# Altium footprint library ICs And Semiconductors SMD.PcbLib: 602 footprints (part 1 of 38)
Each footprint in its own frame and in the unit in brackets; x right, y up, seen from the top. Pads: shape width x height; smd on the part's side, far side on the other; paste and mask are expansions set on the pad; w line width, h text height; cw(c..) or ccw(c..) is an arc to the next point about the centre after c.
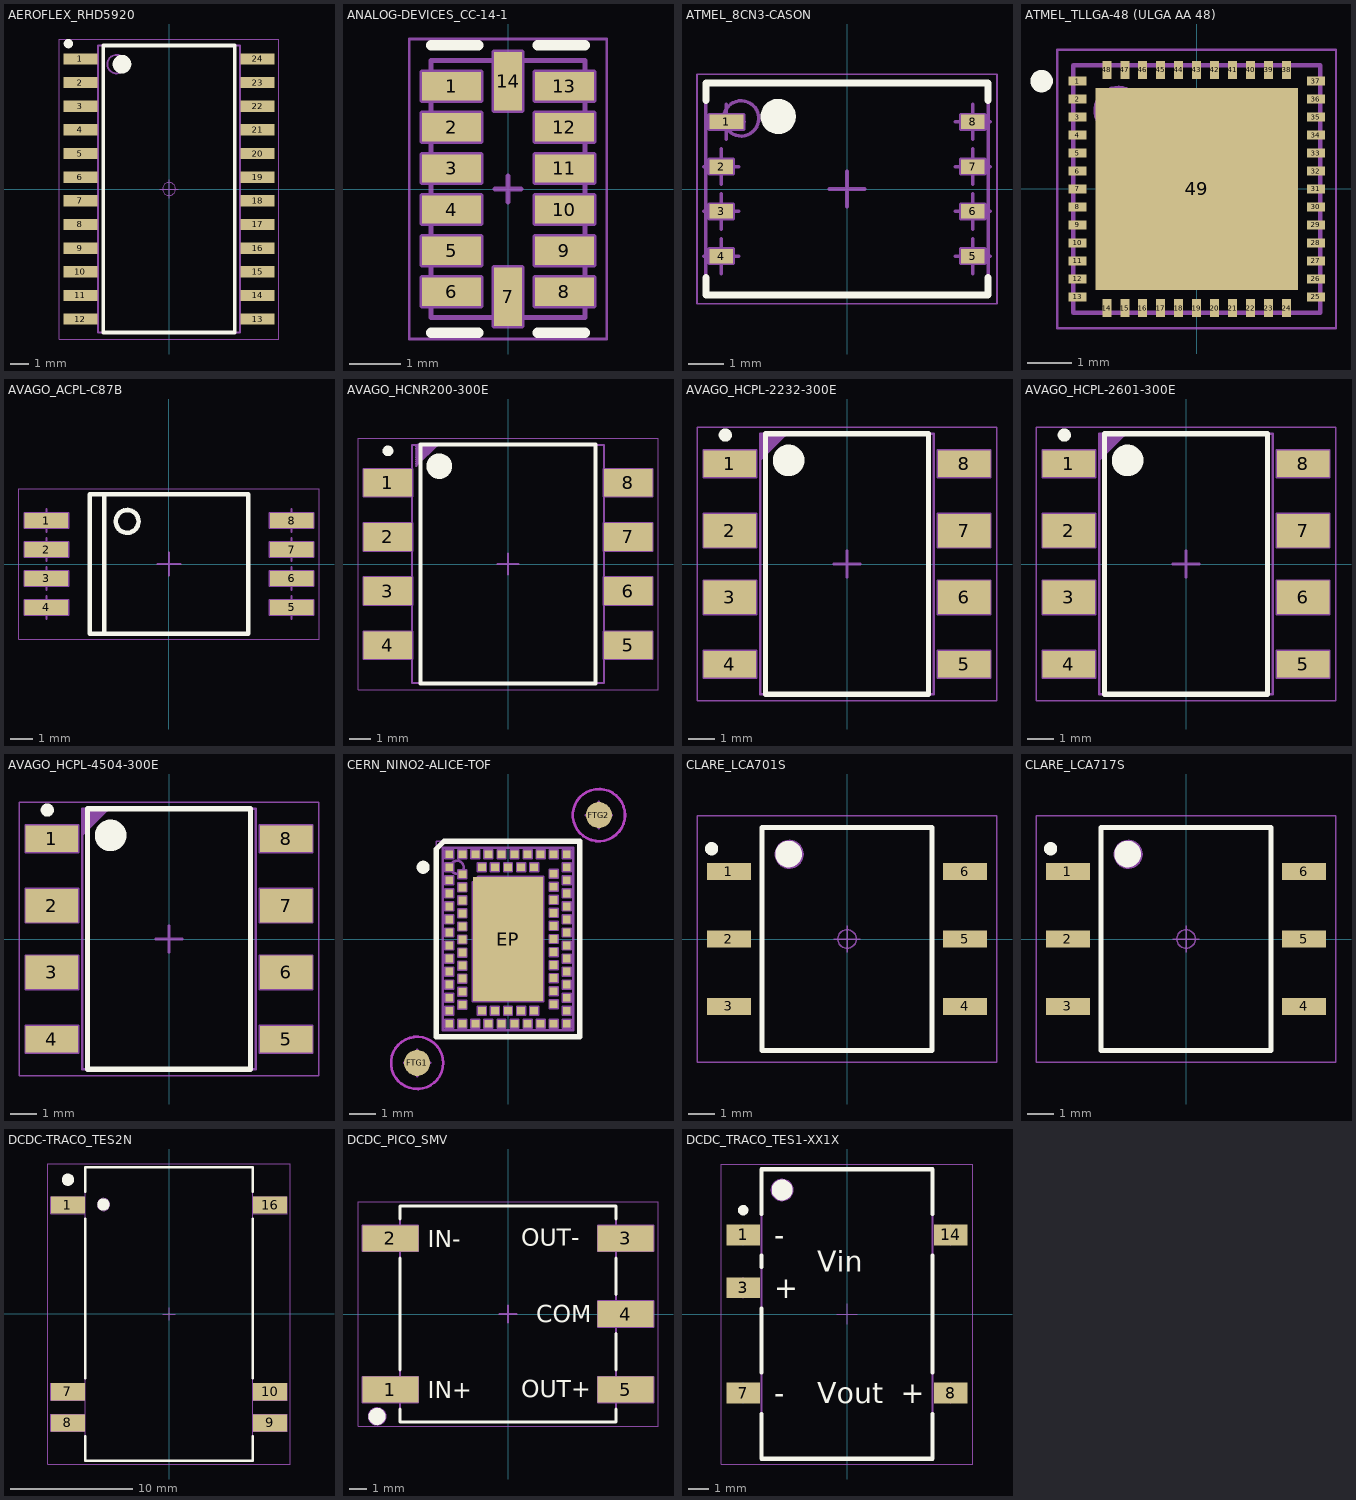
[diagram p0: the footprints below, top view; thin cyan lines are the x and y axes]

## AEROFLEX_RHD5920 [mm] "Hermetic Ceramic SOIC, 1.27mm Pitch; 24 Pin, 7.62mm W X 15.59mm L X 3.048mm H Body"
height 3.048
pads (24):
  rect 1.8x0.6 smd: 1(-4.75,6.985) 2(-4.75,5.715) 3(-4.75,4.445) 4(-4.75,3.175) 5(-4.75,1.905) 6(-4.75,0.635) 7(-4.75,-0.635) 8(-4.75,-1.905) 9(-4.75,-3.175) 10(-4.75,-4.445) 11(-4.75,-5.715) 12(-4.75,-6.985) 13(4.75,-6.985) 14(4.75,-5.715) 15(4.75,-4.445) 16(4.75,-3.175) 17(4.75,-1.905) 18(4.75,-0.635) 19(4.75,0.635) 20(4.75,1.905) 21(4.75,3.175) 22(4.75,4.445) 23(4.75,5.715) 24(4.75,6.985)
Top Overlay:
  circle w0.5: c-2.525,6.7 r0.25
  circle w0.25: c-5.4,7.8 r0.125
  lines w0.2: -3.525,-7.7 3.525,-7.7 3.525,7.7 -3.525,7.7 -3.525,-7.7
Mechanical 14:
  circle w0.1: c-2.81,6.7 r0.5
  lines w0.1: -3.81,-7.7 3.81,-7.7 3.81,7.7 -3.81,7.7 -3.81,-7.7
Mechanical 15:
  circle w0.05: c0,0 r0.35
  lines w0.05: -0.5,0 0.5,0 ; 0,-0.5 0,0.5 ; -5.9,-8.05 5.9,-8.05 5.9,8.05 -5.9,8.05 -5.9,-8.05
3D body "AEROFLEX_RHD5920.stp": height 3.05, standoff 0, extent -5.16,-7.8 5.16,7.8

## ANALOG-DEVICES_CC-14-1 [mm] "LGA, 0.50mm pitch, 14 Pin, 3.00mm L X 5.00mm W X 1.00mm H body, ANALOG DEVICE CC-14-1"
height 1
pads (14):
  rect 1.145x0.55 smd: 1(-1.098,2) 2(-1.098,1.2) 3(-1.098,0.4) 4(-1.098,-0.4) 5(-1.098,-1.2) 6(-1.098,-2) 8(1.098,-2) 9(1.098,-1.2) 10(1.098,-0.4) 11(1.098,0.4) 12(1.098,1.2) 13(1.098,2)
  rect 0.55x1.145 smd: 7(0,-2.098) 14(0,2.098)
Top Overlay:
  lines w0.2: -1.5,-2.8 -0.575,-2.8 ; -1.5,2.8 -0.575,2.8 ; 0.575,-2.8 1.5,-2.8 ; 0.575,2.8 1.5,2.8
Mechanical 8:
  lines w0.1: -1.348,-2 -1.098,-2 ; -1.348,-1.2 -1.098,-1.2 ; -1.348,-0.4 -1.098,-0.4 ; -1.348,0.4 -1.098,0.4 ; -1.348,1.2 -1.098,1.2 ; -1.348,2 -1.098,2 ; -1.098,-2.25 -1.098,-2 ; -1.098,-1.75 -1.098,-2 ; -1.098,-1.45 -1.098,-1.2 ; -1.098,-0.95 -1.098,-1.2 ; -1.098,-0.65 -1.098,-0.4 ; -1.098,-0.15 -1.098,-0.4 ; -1.098,0.15 -1.098,0.4 ; -1.098,0.65 -1.098,0.4 ; -1.098,0.95 -1.098,1.2 ; -1.098,1.45 -1.098,1.2 ; -1.098,1.75 -1.098,2 ; -1.098,2.25 -1.098,2 ; -0.848,-2 -1.098,-2 ; -0.848,-1.2 -1.098,-1.2 ; -0.848,-0.4 -1.098,-0.4 ; -0.848,0.4 -1.098,0.4 ; -0.848,1.2 -1.098,1.2 ; -0.848,2 -1.098,2 ; -0.25,-2.098 0,-2.098 ; -0.25,0 0,0 ; -0.25,2.098 0,2.098 ; 0,-2.348 0,-2.098 ; 0,-1.848 0,-2.098 ; 0,-0.25 0,0 ; 0,0.25 0,0 ; 0,1.848 0,2.098 ; 0,2.348 0,2.098 ; 0.25,-2.098 0,-2.098 ; 0.25,0 0,0 ; 0.25,2.098 0,2.098 ; 0.848,-2 1.098,-2 ; 0.848,-1.2 1.098,-1.2 ; 0.848,-0.4 1.098,-0.4 ; 0.848,0.4 1.098,0.4 ; 0.848,1.2 1.098,1.2 ; 0.848,2 1.098,2 ; 1.098,-2.25 1.098,-2 ; 1.098,-1.75 1.098,-2 ; 1.098,-1.45 1.098,-1.2 ; 1.098,-0.95 1.098,-1.2 ; 1.098,-0.65 1.098,-0.4 ; 1.098,-0.15 1.098,-0.4 ; 1.098,0.15 1.098,0.4 ; 1.098,0.65 1.098,0.4 ; 1.098,0.95 1.098,1.2 ; 1.098,1.45 1.098,1.2 ; 1.098,1.75 1.098,2 ; 1.098,2.25 1.098,2 ; 1.348,-2 1.098,-2 ; 1.348,-1.2 1.098,-1.2 ; 1.348,-0.4 1.098,-0.4 ; 1.348,0.4 1.098,0.4 ; 1.348,1.2 1.098,1.2 ; 1.348,2 1.098,2 ; -1.67,-2.275 -1.67,-1.725 -0.525,-1.725 -0.525,-2.275 -1.67,-2.275 ; -1.67,-1.475 -1.67,-0.925 -0.525,-0.925 -0.525,-1.475 -1.67,-1.475 ; -1.67,-0.675 -1.67,-0.125 -0.525,-0.125 -0.525,-0.675 -1.67,-0.675 ; -1.67,0.125 -1.67,0.675 -0.525,0.675 -0.525,0.125 -1.67,0.125 ; -1.67,0.925 -1.67,1.475 -0.525,1.475 -0.525,0.925 -1.67,0.925 ; -1.67,1.725 -1.67,2.275 -0.525,2.275 -0.525,1.725 -1.67,1.725 ; -0.275,-2.67 -0.275,-1.525 0.275,-1.525 0.275,-2.67 -0.275,-2.67 ; -0.275,1.525 -0.275,2.67 0.275,2.67 0.275,1.525 -0.275,1.525 ; 0.525,-2.275 1.67,-2.275 1.67,-1.725 0.525,-1.725 0.525,-2.275 ; 0.525,-1.475 1.67,-1.475 1.67,-0.925 0.525,-0.925 0.525,-1.475 ; 0.525,-0.675 1.67,-0.675 1.67,-0.125 0.525,-0.125 0.525,-0.675 ; 0.525,0.125 1.67,0.125 1.67,0.675 0.525,0.675 0.525,0.125 ; 0.525,0.925 1.67,0.925 1.67,1.475 0.525,1.475 0.525,0.925 ; 0.525,1.725 1.67,1.725 1.67,2.275 0.525,2.275 0.525,1.725
Mechanical 14:
  circle w0.1: c-1,2 r0.25
  lines w0.1: -1.5,-2.5 1.5,-2.5 1.5,2.5 -1.5,2.5 -1.5,-2.5
Mechanical 15:
  lines w0.05: -1.92,-2.92 1.92,-2.92 1.92,2.92 -1.92,2.92 -1.92,-2.92
3D body "ANALOG-DEVICES_CC-14-1.stp": height 0.79, standoff 0, extent -1.5,-2.5 1.5,2.5

## ATMEL_8CN3-CASON [mm] "ATMEL 8CN3 Case, SON, 1.27mm Pitch; 8 Pin, 8.00mm W X 6.00mm L X 1.00mm H body"
height 1
pads (8):
  rect 0.97x0.41 smd: 1(-3.415,1.905)
  rect 0.67x0.41 smd: 2(-3.565,0.635) 3(-3.565,-0.635) 4(-3.565,-1.905) 5(3.565,-1.905) 6(3.565,-0.635) 7(3.565,0.635) 8(3.565,1.905)
Top Overlay:
  circle w0.5: c-1.95,2.055 r0.25
  lines w0.2: -4,-2.51 -4,-3 4,-3 4,-2.51 ; -4,2.51 -4,3 4,3 4,2.51
Mechanical 8:
  lines w0.1: -4.065,-1.905 -3.565,-1.905 ; -4.065,-0.635 -3.565,-0.635 ; -4.065,0.635 -3.565,0.635 ; -3.915,1.905 -3.415,1.905 ; -3.565,-2.405 -3.565,-1.905 ; -3.565,-1.405 -3.565,-1.905 ; -3.565,-1.135 -3.565,-0.635 ; -3.565,-0.135 -3.565,-0.635 ; -3.565,0.135 -3.565,0.635 ; -3.565,1.135 -3.565,0.635 ; -3.415,1.405 -3.415,1.905 ; -3.415,2.405 -3.415,1.905 ; -3.065,-1.905 -3.565,-1.905 ; -3.065,-0.635 -3.565,-0.635 ; -3.065,0.635 -3.565,0.635 ; -2.915,1.905 -3.415,1.905 ; -0.5,0 0,0 ; 0,-0.5 0,0 ; 0,0.5 0,0 ; 0.5,0 0,0 ; 3.065,-1.905 3.565,-1.905 ; 3.065,-0.635 3.565,-0.635 ; 3.065,0.635 3.565,0.635 ; 3.065,1.905 3.565,1.905 ; 3.565,-2.405 3.565,-1.905 ; 3.565,-1.405 3.565,-1.905 ; 3.565,-1.135 3.565,-0.635 ; 3.565,-0.135 3.565,-0.635 ; 3.565,0.135 3.565,0.635 ; 3.565,1.135 3.565,0.635 ; 3.565,1.405 3.565,1.905 ; 3.565,2.405 3.565,1.905 ; 4.065,-1.905 3.565,-1.905 ; 4.065,-0.635 3.565,-0.635 ; 4.065,0.635 3.565,0.635 ; 4.065,1.905 3.565,1.905 ; -3.9,-2.11 -3.9,-1.7 -3.23,-1.7 -3.23,-2.11 -3.9,-2.11 ; -3.9,-0.84 -3.9,-0.43 -3.23,-0.43 -3.23,-0.84 -3.9,-0.84 ; -3.9,0.43 -3.9,0.84 -3.23,0.84 -3.23,0.43 -3.9,0.43 ; -3.9,1.7 -3.9,2.11 -2.93,2.11 -2.93,1.7 -3.9,1.7 ; 3.23,-2.11 3.9,-2.11 3.9,-1.7 3.23,-1.7 3.23,-2.11 ; 3.23,-0.84 3.9,-0.84 3.9,-0.43 3.23,-0.43 3.23,-0.84 ; 3.23,0.43 3.23,0.84 3.9,0.84 3.9,0.43 3.23,0.43 ; 3.23,1.7 3.23,2.11 3.9,2.11 3.9,1.7 3.23,1.7
Mechanical 14:
  circle w0.1: c-3,2 r0.5
  lines w0.1: -4,-3 4,-3 4,3 -4,3 -4,-3
Mechanical 15:
  lines w0.05: -4.25,-3.25 4.25,-3.25 4.25,3.25 -4.25,3.25 -4.25,-3.25
3D body "ATMEL_8CN3-CASON.stp": height 1, standoff 0, extent -4,-3 4,3

## ATMEL_TLLGA-48 (ULGA AA 48) [mm] "QFN,0.40mm pitch,square;48 pin,5.50mm L X 5.50mm W X 0.60mm H body (w/pullback leads,thermal tab 4.5 X 4.5mm), IPC Medium Density"
height 0.6
pads (49):
  rect 0.4x0.2 smd: 1(-2.65,2.4) 2(-2.65,2) 3(-2.65,1.6) 4(-2.65,1.2) 5(-2.65,0.8) 6(-2.65,0.4) 7(-2.65,0) 8(-2.65,-0.4) 9(-2.65,-0.8) 10(-2.65,-1.2) 11(-2.65,-1.6) 12(-2.65,-2) 13(-2.65,-2.4) 25(2.65,-2.4) 26(2.65,-2) 27(2.65,-1.6) 28(2.65,-1.2) 29(2.65,-0.8) 30(2.65,-0.4) 31(2.65,0) 32(2.65,0.4) 33(2.65,0.8) 34(2.65,1.2) 35(2.65,1.6) 36(2.65,2) 37(2.65,2.4)
  rect 0.2x0.4 smd: 14(-2,-2.65) 15(-1.6,-2.65) 16(-1.2,-2.65) 17(-0.8,-2.65) 18(-0.4,-2.65) 19(0,-2.65) 20(0.4,-2.65) 21(0.8,-2.65) 22(1.2,-2.65) 23(1.6,-2.65) 24(2,-2.65) 38(2,2.65) 39(1.6,2.65) 40(1.2,2.65) 41(0.8,2.65) 42(0.4,2.65) 43(0,2.65) 44(-0.4,2.65) 45(-0.8,2.65) 46(-1.2,2.65) 47(-1.6,2.65) 48(-2,2.65)
  rect 4.5x4.5 smd: 49(0,0)
Top Overlay:
  circle w0.25: c-3.45,2.4 r0.125
Top Paste:
  region: -1.7,-1.7 -1.7,-0.28 -0.28,-0.28 -0.28,-1.7
  region: 0.28,-1.7 0.28,-0.28 1.7,-0.28 1.7,-1.7
  region: -1.7,0.28 -1.7,1.7 -0.28,1.7 -0.28,0.28
  region: 0.28,0.28 0.28,1.7 1.7,1.7 1.7,0.28
Mechanical 14:
  circle w0.1: c-1.75,1.75 r0.5
  lines w0.1: -2.75,-2.75 -2.75,2.75 2.75,2.75 2.75,-2.75 -2.75,-2.75
  text "1" at 0.45,-0.164 h0.75
Mechanical 15:
  circle w0.05: c0,0 r0.35
  lines w0.05: -0.5,0 0.5,0 ; 0,-0.5 0,0.5 ; -3.1,-3.1 -3.1,3.1 3.1,3.1 3.1,-3.1 -3.1,-3.1
3D body "ATMEL_TLLGA-48 (ULGA AA 48).stp": height 0.6, standoff 0, extent -2.75,-2.75 2.75,2.75

## AVAGO_ACPL-C87B [mm] "8-Leads Stretched Surface Mount SO Package, Body 6.807x5.859mm, Pitch 1.27mm"
height 3.6
pads (8):
  rect 1.905x0.64 smd: 1(-5.372,1.905) 2(-5.372,0.635) 3(-5.372,-0.635) 4(-5.372,-1.905) 5(5.373,-1.905) 6(5.373,-0.635) 7(5.373,0.635) 8(5.373,1.905)
Top Overlay:
  circle w0.2: c-1.832,1.867 r0.5
  lines w0.2: -2.832,-3.052 -2.832,3.052 ; -3.467,-3.052 3.467,-3.052 3.467,3.052 -3.467,3.052 -3.467,-3.052
Mechanical 8:
  lines w0.1: -5.872,-1.905 -5.372,-1.905 ; -5.872,-0.635 -5.372,-0.635 ; -5.872,0.635 -5.372,0.635 ; -5.872,1.905 -5.372,1.905 ; -5.372,-2.405 -5.372,-1.905 ; -5.372,-1.405 -5.372,-1.905 ; -5.372,-1.135 -5.372,-0.635 ; -5.372,-0.135 -5.372,-0.635 ; -5.372,0.135 -5.372,0.635 ; -5.372,1.135 -5.372,0.635 ; -5.372,1.405 -5.372,1.905 ; -5.372,2.405 -5.372,1.905 ; -4.872,-1.905 -5.372,-1.905 ; -4.872,-0.635 -5.372,-0.635 ; -4.872,0.635 -5.372,0.635 ; -4.872,1.905 -5.372,1.905 ; -0.5,0 0,0 ; 0,-0.5 0,0 ; 0,0.5 0,0 ; 0.5,0 0,0 ; 4.873,-1.905 5.373,-1.905 ; 4.873,-0.635 5.373,-0.635 ; 4.873,0.635 5.373,0.635 ; 4.873,1.905 5.373,1.905 ; 5.373,-2.405 5.373,-1.905 ; 5.373,-1.405 5.373,-1.905 ; 5.373,-1.135 5.373,-0.635 ; 5.373,-0.135 5.373,-0.635 ; 5.373,0.135 5.373,0.635 ; 5.373,1.135 5.373,0.635 ; 5.373,1.405 5.373,1.905 ; 5.373,2.405 5.373,1.905 ; 5.873,-1.905 5.373,-1.905 ; 5.873,-0.635 5.373,-0.635 ; 5.873,0.635 5.373,0.635 ; 5.873,1.905 5.373,1.905 ; -6.325,-2.225 -6.325,-1.585 -4.42,-1.585 -4.42,-2.225 -6.325,-2.225 ; -6.325,-0.955 -6.325,-0.315 -4.42,-0.315 -4.42,-0.955 -6.325,-0.955 ; -6.325,0.315 -6.325,0.955 -4.42,0.955 -4.42,0.315 -6.325,0.315 ; -6.325,1.585 -6.325,2.225 -4.42,2.225 -4.42,1.585 -6.325,1.585 ; 4.42,-2.225 4.42,-1.585 6.325,-1.585 6.325,-2.225 4.42,-2.225 ; 4.42,-0.955 4.42,-0.315 6.325,-0.315 6.325,-0.955 4.42,-0.955 ; 4.42,0.315 4.42,0.955 6.325,0.955 6.325,0.315 4.42,0.315 ; 4.42,1.585 4.42,2.225 6.325,2.225 6.325,1.585 4.42,1.585
Mechanical 14:
  circle w0.1: c-1.832,1.867 r0.5
  lines w0.1: -2.832,-3.052 -2.832,3.052 ; -3.467,-3.052 3.467,-3.052 3.467,3.052 -3.467,3.052 -3.467,-3.052
Mechanical 15:
  lines w0.05: -6.575,-3.302 -6.575,3.302 6.575,3.302 6.575,-3.302 -6.575,-3.302
3D body "AVAGO_ACPL-C87B.stp": height 3.61, standoff 0, extent -5.75,-3.052 5.75,3.052

## AVAGO_HCNR200-300E [mm] "DIP Gull Wing Surface Mount, 8-Leads, Body 11.15x9mm, Pitch 2.54mm"
height 4
pads (8):
  rect 2.29x1.3 smd: 1(-5.635,3.81) 2(-5.635,1.27) 3(-5.635,-1.27) 4(-5.635,-3.81) 5(5.635,-3.81) 6(5.635,-1.27) 7(5.635,1.27) 8(5.635,3.81)
Top Overlay:
  circle w0.6: c-3.22,4.585 r0.3
  circle w0.25: c-5.625,5.3 r0.125
  lines w0.2: -4.1,-5.6 -4.1,5.6 4.1,5.6 4.1,-5.6 -4.1,-5.6
Mechanical 8:
  lines w0.1: -6.135,-3.81 -5.635,-3.81 ; -6.135,-1.27 -5.635,-1.27 ; -6.135,1.27 -5.635,1.27 ; -6.135,3.81 -5.635,3.81 ; -5.635,-4.31 -5.635,-3.81 ; -5.635,-3.31 -5.635,-3.81 ; -5.635,-1.77 -5.635,-1.27 ; -5.635,-0.77 -5.635,-1.27 ; -5.635,0.77 -5.635,1.27 ; -5.635,1.77 -5.635,1.27 ; -5.635,3.31 -5.635,3.81 ; -5.635,4.31 -5.635,3.81 ; -5.135,-3.81 -5.635,-3.81 ; -5.135,-1.27 -5.635,-1.27 ; -5.135,1.27 -5.635,1.27 ; -5.135,3.81 -5.635,3.81 ; -0.5,0 0,0 ; 0,-0.5 0,0 ; 0,0.5 0,0 ; 0.5,0 0,0 ; 5.135,-3.81 5.635,-3.81 ; 5.135,-1.27 5.635,-1.27 ; 5.135,1.27 5.635,1.27 ; 5.135,3.81 5.635,3.81 ; 5.635,-4.31 5.635,-3.81 ; 5.635,-3.31 5.635,-3.81 ; 5.635,-1.77 5.635,-1.27 ; 5.635,-0.77 5.635,-1.27 ; 5.635,0.77 5.635,1.27 ; 5.635,1.77 5.635,1.27 ; 5.635,3.31 5.635,3.81 ; 5.635,4.31 5.635,3.81 ; 6.135,-3.81 5.635,-3.81 ; 6.135,-1.27 5.635,-1.27 ; 6.135,1.27 5.635,1.27 ; 6.135,3.81 5.635,3.81 ; -6.78,-4.46 -6.78,-3.16 -4.49,-3.16 -4.49,-4.46 -6.78,-4.46 ; -6.78,-1.92 -6.78,-0.62 -4.49,-0.62 -4.49,-1.92 -6.78,-1.92 ; -6.78,0.62 -6.78,1.92 -4.49,1.92 -4.49,0.62 -6.78,0.62 ; -6.78,3.16 -6.78,4.46 -4.49,4.46 -4.49,3.16 -6.78,3.16 ; 4.49,-4.46 4.49,-3.16 6.78,-3.16 6.78,-4.46 4.49,-4.46 ; 4.49,-1.92 6.78,-1.92 6.78,-0.62 4.49,-0.62 4.49,-1.92 ; 4.49,0.62 6.78,0.62 6.78,1.92 4.49,1.92 4.49,0.62 ; 4.49,3.16 6.78,3.16 6.78,4.46 4.49,4.46 4.49,3.16
Mechanical 14:
  lines w0.1: -4.3,4.6 -3.3,5.6 ; -4.3,4.7 -3.4,5.6 ; -4.3,4.8 -3.5,5.6 ; -4.3,4.9 -3.6,5.6 ; -4.3,5 -3.7,5.6 ; -4.3,5.1 -3.8,5.6 ; -4.3,5.2 -3.9,5.6 ; -4.3,5.3 -4,5.6 ; -4.3,5.4 -4.1,5.6 ; -4.3,5.5 -4.2,5.6 ; -4.5,-5.575 -4.5,5.575 4.5,5.575 4.5,-5.575 -4.5,-5.575
Mechanical 15:
  lines w0.05: -7.03,-5.9 7.03,-5.9 7.03,5.9 -7.03,5.9 -7.03,-5.9
3D body "AVAGO_HCNR200-300E.stp": height 4.01, standoff 0, extent -6.15,-5.65 6.15,5.65

## AVAGO_HCPL-2232-300E [mm] "SOIC, 2.54mm Pitch, 8 Pin, Body 6.35mm W X 9.65mm L X 4.45mm H, AVAGO 8-pin DIP Package With Gull Wing Surface Mount Option 300"
height 4.45
pads (8):
  rect 2x1.016 smd: 1(-4.45,3.81) 4(-4.45,-3.81) 5(4.45,-3.81) 8(4.45,3.81)
  rect 2x1.27 smd: 2(-4.45,1.27) 3(-4.45,-1.27) 6(4.45,-1.27) 7(4.45,1.27)
Top Overlay:
  circle w0.6: c-2.22,3.935 r0.3
  circle w0.25: c-4.625,4.9 r0.125
  lines w0.2: -3.1,-4.95 3.1,-4.95 3.1,4.95 -3.1,4.95 -3.1,-4.95
Mechanical 8:
  lines w0.1: -4.95,-3.81 -4.45,-3.81 ; -4.95,-1.27 -4.45,-1.27 ; -4.95,1.27 -4.45,1.27 ; -4.95,3.81 -4.45,3.81 ; -4.45,-4.31 -4.45,-3.81 ; -4.45,-3.31 -4.45,-3.81 ; -4.45,-1.77 -4.45,-1.27 ; -4.45,-0.77 -4.45,-1.27 ; -4.45,0.77 -4.45,1.27 ; -4.45,1.77 -4.45,1.27 ; -4.45,3.31 -4.45,3.81 ; -4.45,4.31 -4.45,3.81 ; -3.95,-3.81 -4.45,-3.81 ; -3.95,-1.27 -4.45,-1.27 ; -3.95,1.27 -4.45,1.27 ; -3.95,3.81 -4.45,3.81 ; -0.5,0 0,0 ; 0,-0.5 0,0 ; 0,0.5 0,0 ; 0.5,0 0,0 ; 3.95,-3.81 4.45,-3.81 ; 3.95,-1.27 4.45,-1.27 ; 3.95,1.27 4.45,1.27 ; 3.95,3.81 4.45,3.81 ; 4.45,-4.31 4.45,-3.81 ; 4.45,-3.31 4.45,-3.81 ; 4.45,-1.77 4.45,-1.27 ; 4.45,-0.77 4.45,-1.27 ; 4.45,0.77 4.45,1.27 ; 4.45,1.77 4.45,1.27 ; 4.45,3.31 4.45,3.81 ; 4.45,4.31 4.45,3.81 ; 4.95,-3.81 4.45,-3.81 ; 4.95,-1.27 4.45,-1.27 ; 4.95,1.27 4.45,1.27 ; 4.95,3.81 4.45,3.81 ; -5.45,-4.318 -5.45,-3.302 -3.45,-3.302 -3.45,-4.318 -5.45,-4.318 ; -5.45,-1.905 -3.45,-1.905 -3.45,-0.635 -5.45,-0.635 -5.45,-1.905 ; -5.45,0.635 -3.45,0.635 -3.45,1.905 -5.45,1.905 -5.45,0.635 ; -5.45,3.302 -5.45,4.318 -3.45,4.318 -3.45,3.302 -5.45,3.302 ; 3.45,-4.318 3.45,-3.302 5.45,-3.302 5.45,-4.318 3.45,-4.318 ; 3.45,-1.905 5.45,-1.905 5.45,-0.635 3.45,-0.635 3.45,-1.905 ; 3.45,0.635 5.45,0.635 5.45,1.905 3.45,1.905 3.45,0.635 ; 3.45,3.302 3.45,4.318 5.45,4.318 5.45,3.302 3.45,3.302
Mechanical 14:
  lines w0.1: -3.3,3.95 -2.3,4.95 ; -3.3,4.05 -2.4,4.95 ; -3.3,4.15 -2.5,4.95 ; -3.3,4.25 -2.6,4.95 ; -3.3,4.35 -2.7,4.95 ; -3.3,4.45 -2.8,4.95 ; -3.3,4.55 -2.9,4.95 ; -3.3,4.65 -3,4.95 ; -3.3,4.75 -3.1,4.95 ; -3.3,4.85 -3.2,4.95 ; -3.3,-4.95 3.3,-4.95 3.3,4.95 -3.3,4.95 -3.3,-4.95
Mechanical 15:
  lines w0.05: -5.7,-5.2 -5.7,5.2 5.7,5.2 5.7,-5.2 -5.7,-5.2
3D body "AVAGO_HCPL-2232-300E.stp": height 4.45, standoff 0, extent -4.95,-4.95 4.95,4.95

## AVAGO_HCPL-2601-300E [mm] "SOIC, 2.54mm Pitch, 8 Pin, Body 6.35mm W X 9.65mm L X 4.45mm H, AVAGO 8-pin DIP Package With Gull Wing Surface Mount Option 300"
height 4.45
pads (8):
  rect 2x1.016 smd: 1(-4.45,3.81) 4(-4.45,-3.81) 5(4.45,-3.81) 8(4.45,3.81)
  rect 2x1.27 smd: 2(-4.45,1.27) 3(-4.45,-1.27) 6(4.45,-1.27) 7(4.45,1.27)
Top Overlay:
  circle w0.25: c-4.625,4.9 r0.125
  circle w0.6: c-2.22,3.935 r0.3
  lines w0.2: -3.1,-4.95 -3.1,4.95 3.1,4.95 3.1,-4.95 -3.1,-4.95
Mechanical 8:
  lines w0.1: -4.95,-3.81 -4.45,-3.81 ; -4.95,-1.27 -4.45,-1.27 ; -4.95,1.27 -4.45,1.27 ; -4.95,3.81 -4.45,3.81 ; -4.45,-4.31 -4.45,-3.81 ; -4.45,-3.31 -4.45,-3.81 ; -4.45,-1.77 -4.45,-1.27 ; -4.45,-0.77 -4.45,-1.27 ; -4.45,0.77 -4.45,1.27 ; -4.45,1.77 -4.45,1.27 ; -4.45,3.31 -4.45,3.81 ; -4.45,4.31 -4.45,3.81 ; -3.95,-3.81 -4.45,-3.81 ; -3.95,-1.27 -4.45,-1.27 ; -3.95,1.27 -4.45,1.27 ; -3.95,3.81 -4.45,3.81 ; -0.5,0 0,0 ; 0,-0.5 0,0 ; 0,0.5 0,0 ; 0.5,0 0,0 ; 3.95,-3.81 4.45,-3.81 ; 3.95,-1.27 4.45,-1.27 ; 3.95,1.27 4.45,1.27 ; 3.95,3.81 4.45,3.81 ; 4.45,-4.31 4.45,-3.81 ; 4.45,-3.31 4.45,-3.81 ; 4.45,-1.77 4.45,-1.27 ; 4.45,-0.77 4.45,-1.27 ; 4.45,0.77 4.45,1.27 ; 4.45,1.77 4.45,1.27 ; 4.45,3.31 4.45,3.81 ; 4.45,4.31 4.45,3.81 ; 4.95,-3.81 4.45,-3.81 ; 4.95,-1.27 4.45,-1.27 ; 4.95,1.27 4.45,1.27 ; 4.95,3.81 4.45,3.81 ; -5.45,-4.318 -3.45,-4.318 -3.45,-3.302 -5.45,-3.302 -5.45,-4.318 ; -5.45,-1.905 -5.45,-0.635 -3.45,-0.635 -3.45,-1.905 -5.45,-1.905 ; -5.45,0.635 -5.45,1.905 -3.45,1.905 -3.45,0.635 -5.45,0.635 ; -5.45,3.302 -3.45,3.302 -3.45,4.318 -5.45,4.318 -5.45,3.302 ; 3.45,-4.318 5.45,-4.318 5.45,-3.302 3.45,-3.302 3.45,-4.318 ; 3.45,-1.905 3.45,-0.635 5.45,-0.635 5.45,-1.905 3.45,-1.905 ; 3.45,0.635 3.45,1.905 5.45,1.905 5.45,0.635 3.45,0.635 ; 3.45,3.302 5.45,3.302 5.45,4.318 3.45,4.318 3.45,3.302
Mechanical 14:
  lines w0.1: -3.3,3.95 -2.3,4.95 ; -3.3,4.05 -2.4,4.95 ; -3.3,4.15 -2.5,4.95 ; -3.3,4.25 -2.6,4.95 ; -3.3,4.35 -2.7,4.95 ; -3.3,4.45 -2.8,4.95 ; -3.3,4.55 -2.9,4.95 ; -3.3,4.65 -3,4.95 ; -3.3,4.75 -3.1,4.95 ; -3.3,4.85 -3.2,4.95 ; -3.3,-4.95 -3.3,4.95 3.3,4.95 3.3,-4.95 -3.3,-4.95
Mechanical 15:
  lines w0.05: -5.7,-5.2 5.7,-5.2 5.7,5.2 -5.7,5.2 -5.7,-5.2
3D body "AVAGO_HCPL-2601-300E.stp": height 4.45, standoff 0, extent -4.95,-4.95 4.95,4.95

## AVAGO_HCPL-4504-300E [mm] "SOIC, 2.54mm Pitch, 8 Pin, Body 6.35mm W X 9.65mm L X 4.45mm H, AVAGO 8-pin DIP Package With Gull Wing Surface Mount Option 300"
height 4.45
pads (8):
  rect 2x1.016 smd: 1(-4.45,3.81) 4(-4.45,-3.81) 5(4.45,-3.81) 8(4.45,3.81)
  rect 2x1.27 smd: 2(-4.45,1.27) 3(-4.45,-1.27) 6(4.45,-1.27) 7(4.45,1.27)
Top Overlay:
  circle w0.6: c-2.22,3.935 r0.3
  circle w0.25: c-4.625,4.9 r0.125
  lines w0.2: -3.1,-4.95 3.1,-4.95 3.1,4.95 -3.1,4.95 -3.1,-4.95
Mechanical 8:
  lines w0.1: -4.95,-3.81 -4.45,-3.81 ; -4.95,-1.27 -4.45,-1.27 ; -4.95,1.27 -4.45,1.27 ; -4.95,3.81 -4.45,3.81 ; -4.45,-4.31 -4.45,-3.81 ; -4.45,-3.31 -4.45,-3.81 ; -4.45,-1.77 -4.45,-1.27 ; -4.45,-0.77 -4.45,-1.27 ; -4.45,0.77 -4.45,1.27 ; -4.45,1.77 -4.45,1.27 ; -4.45,3.31 -4.45,3.81 ; -4.45,4.31 -4.45,3.81 ; -3.95,-3.81 -4.45,-3.81 ; -3.95,-1.27 -4.45,-1.27 ; -3.95,1.27 -4.45,1.27 ; -3.95,3.81 -4.45,3.81 ; -0.5,0 0,0 ; 0,-0.5 0,0 ; 0,0.5 0,0 ; 0.5,0 0,0 ; 3.95,-3.81 4.45,-3.81 ; 3.95,-1.27 4.45,-1.27 ; 3.95,1.27 4.45,1.27 ; 3.95,3.81 4.45,3.81 ; 4.45,-4.31 4.45,-3.81 ; 4.45,-3.31 4.45,-3.81 ; 4.45,-1.77 4.45,-1.27 ; 4.45,-0.77 4.45,-1.27 ; 4.45,0.77 4.45,1.27 ; 4.45,1.77 4.45,1.27 ; 4.45,3.31 4.45,3.81 ; 4.45,4.31 4.45,3.81 ; 4.95,-3.81 4.45,-3.81 ; 4.95,-1.27 4.45,-1.27 ; 4.95,1.27 4.45,1.27 ; 4.95,3.81 4.45,3.81 ; -5.45,-4.318 -5.45,-3.302 -3.45,-3.302 -3.45,-4.318 -5.45,-4.318 ; -5.45,-1.905 -3.45,-1.905 -3.45,-0.635 -5.45,-0.635 -5.45,-1.905 ; -5.45,0.635 -3.45,0.635 -3.45,1.905 -5.45,1.905 -5.45,0.635 ; -5.45,3.302 -5.45,4.318 -3.45,4.318 -3.45,3.302 -5.45,3.302 ; 3.45,-4.318 3.45,-3.302 5.45,-3.302 5.45,-4.318 3.45,-4.318 ; 3.45,-1.905 5.45,-1.905 5.45,-0.635 3.45,-0.635 3.45,-1.905 ; 3.45,0.635 5.45,0.635 5.45,1.905 3.45,1.905 3.45,0.635 ; 3.45,3.302 3.45,4.318 5.45,4.318 5.45,3.302 3.45,3.302
Mechanical 14:
  lines w0.1: -3.3,3.95 -2.3,4.95 ; -3.3,4.05 -2.4,4.95 ; -3.3,4.15 -2.5,4.95 ; -3.3,4.25 -2.6,4.95 ; -3.3,4.35 -2.7,4.95 ; -3.3,4.45 -2.8,4.95 ; -3.3,4.55 -2.9,4.95 ; -3.3,4.65 -3,4.95 ; -3.3,4.75 -3.1,4.95 ; -3.3,4.85 -3.2,4.95 ; -3.3,-4.95 3.3,-4.95 3.3,4.95 -3.3,4.95 -3.3,-4.95
Mechanical 15:
  lines w0.05: -5.7,-5.2 -5.7,5.2 5.7,5.2 5.7,-5.2 -5.7,-5.2
3D body "AVAGO_HCPL-4504-300E.stp": height 4.45, standoff 0, extent -4.95,-4.95 4.95,4.95

## BGA :-) SEE ICs And Semiconductors SMD_BGA.PcbLib [mm] "Les BGA ont йtйs transferrй dans ICs And Semiconductors SMD_BGA.PcbLib"
Top Layer:
  text "BGA :-) SEE ICs And Semiconductors SMD_BGA.PcbLib" at -107.7,-2.1 h5

## CERN_NINO2-ALICE-TOF [mm] "TAPP Case 5mm X 7mm X 0.8mm H"
height 0.8
pads (79):
  rect 0.3x0.3 smd: A1(-2.25,2.75) A2(-2.25,2.25) A3(-2.25,1.75) A4(-2.25,1.25) A5(-2.25,0.75) A6(-2.25,0.25) A7(-2.25,-0.25) A8(-2.25,-0.75) A9(-2.25,-1.25) A10(-2.25,-1.75) A11(-2.25,-2.25) A12(-2.25,-2.75) A13(-2.25,-3.25) A14(-1.75,-3.25) A15(-1.25,-3.25) A16(-0.75,-3.25) A17(-0.25,-3.25) A18(0.25,-3.25) A19(0.75,-3.25) A20(1.25,-3.25) A21(1.75,-3.25) A22(2.25,-3.25) A23(2.25,-2.75) A24(2.25,-2.25) A25(2.25,-1.75) A26(2.25,-1.25) A27(2.25,-0.75) A28(2.25,-0.25) A29(2.25,0.25) A30(2.25,0.75) A31(2.25,1.25) A32(2.25,1.75) A33(2.25,2.25) A34(2.25,2.75) A35(2.25,3.25) A36(1.75,3.25) A37(1.25,3.25) A38(0.75,3.25) A39(0.25,3.25) A40(-0.25,3.25) A41(-0.75,3.25) A42(-1.25,3.25) A43(-1.75,3.25) A44(-2.25,3.25) B1(-1.75,2.48) B2(-1.75,1.98) B3(-1.75,1.48) B4(-1.75,0.98) B5(-1.75,0.48) B6(-1.75,-0.02) B7(-1.75,-0.52) B8(-1.75,-1.02) B9(-1.75,-1.52) B10(-1.75,-2.02) B11(-1.75,-2.52) B12(-1,-2.75) B13(-0.5,-2.75) B14(0,-2.75) B15(0.5,-2.75) B16(1,-2.75) B17(1.75,-2.5) B18(1.75,-2) B19(1.75,-1.5) B20(1.75,-1) B21(1.75,-0.5) B22(1.75,0) B23(1.75,0.5) B24(1.75,1) B25(1.75,1.5) B26(1.75,2) B27(1.75,2.5) B28(1,2.75) B29(0.5,2.75) B30(0,2.75) B31(-0.5,2.75) B32(-1,2.75)
  rect 2.7x4.75 smd: EP(0,0)
  round 1 smd paste-0.51 mask+0.5: FTG1(-3.483,-4.75) FTG2(3.483,4.75)
Top Layer keep-out:
  circle w0.1: c-3.483,-4.75 r1
  circle w0.1: c3.483,4.75 r1
Top Overlay:
  circle w0.25: c-3.25,2.75 r0.125
  lines w0.2: -2.75,-3.75 2.75,-3.75 2.75,3.75 -2.45,3.75 -2.75,3.45 -2.75,-3.75
Mechanical 8:
  drawing of 475 lines, arcs and shapes, not listed
Mechanical 14:
  circle w0.1: c-1.95,2.75 r0.25
  lines w0.1: -2.5,-3.5 2.5,-3.5 2.5,3.5 -2.5,3.5 -2.5,-3.5
Mechanical 15:
  lines w0.05: -2.75,-3.75 2.75,-3.75 2.75,3.75 -2.75,3.75 -2.75,-3.75

## CLARE_LCA701S [mm] "SOIC, 2.54mm, Pitch; 6 Pin, 6.35mm W X 8.382mm L X 4.699mm H body, CLARE LCA701S Serie"
height 4.69
pads (6):
  rect 1.65x0.65 smd: 1(-4.45,2.54) 2(-4.45,0) 3(-4.45,-2.54) 4(4.45,-2.54) 5(4.45,0) 6(4.45,2.54)
Top Overlay:
  circle w0.25: c-5.1,3.4 r0.125
  circle w0.5: c-2.2,3.2 r0.25
  lines w0.2: -3.2,-4.2 -3.2,4.2 3.2,4.2 3.2,-4.2 -3.2,-4.2
Mechanical 14:
  circle w0.1: c-2.175,3.191 r0.5
  lines w0.1: -3.175,-4.191 -3.175,4.191 3.175,4.191 3.175,-4.191 -3.175,-4.191
Mechanical 15:
  circle w0.05: c0,0 r0.35
  lines w0.05: -0.5,0 0.5,0 ; 0,-0.5 0,0.5 ; -5.65,-4.65 -5.65,4.65 5.65,4.65 5.65,-4.65 -5.65,-4.65
3D body "CLARE_LCA701S.stp": height 4.7, standoff 0, extent -5.052,-4.38 5.053,4.38

## CLARE_LCA717S [mm] "SOIC, 2.54mm, Pitch; 6 Pin, 6.35mm W X 8.382mm L X 4.699mm H body, CLARE LCA717S Serie"
height 4.69
pads (6):
  rect 1.65x0.65 smd: 1(-4.45,2.54) 2(-4.45,0) 3(-4.45,-2.54) 4(4.45,-2.54) 5(4.45,0) 6(4.45,2.54)
Top Overlay:
  circle w0.5: c-2.2,3.2 r0.25
  circle w0.25: c-5.1,3.4 r0.125
  lines w0.2: -3.2,-4.2 3.2,-4.2 3.2,4.2 -3.2,4.2 -3.2,-4.2
Mechanical 14:
  circle w0.1: c-2.175,3.191 r0.5
  lines w0.1: -3.175,-4.191 3.175,-4.191 3.175,4.191 -3.175,4.191 -3.175,-4.191
Mechanical 15:
  circle w0.05: c0,0 r0.35
  lines w0.05: -0.5,0 0.5,0 ; 0,-0.5 0,0.5 ; -5.65,-4.65 5.65,-4.65 5.65,4.65 -5.65,4.65 -5.65,-4.65
3D body "CLARE_LCA717S.stp": height 4.7, standoff 0, extent -5.052,-4.38 5.053,4.38

## DCDC-TRACO_TES2N [mm] "TES 2 Series, DC/DC Converter,  Body 24x13.7mm"
height 8.25
pads (6):
  rect 2.8x1.4 smd: 1(-8.25,8.89) 7(-8.25,-6.35) 8(-8.25,-8.89) 9(8.25,-8.89) 10(8.25,-6.35) 16(8.25,8.89)
Top Overlay:
  circle w0.5: c-5.35,8.94 r0.25
  circle w0.5: c-8.25,10.965 r0.25
  lines w0.2: -6.85,-9.99 -6.85,-12 6.85,-12 6.85,-9.99 ; -6.85,-5.25 -6.85,7.79 ; -6.85,9.99 -6.85,12 6.85,12 6.85,9.99 ; 6.85,-5.25 6.85,7.79
Mechanical 8:
  lines w0.1: -8.75,-8.89 -8.25,-8.89 ; -8.75,-6.35 -8.25,-6.35 ; -8.75,8.89 -8.25,8.89 ; -8.25,-9.39 -8.25,-8.89 ; -8.25,-8.39 -8.25,-8.89 ; -8.25,-6.85 -8.25,-6.35 ; -8.25,-5.85 -8.25,-6.35 ; -8.25,8.39 -8.25,8.89 ; -8.25,9.39 -8.25,8.89 ; -7.75,-8.89 -8.25,-8.89 ; -7.75,-6.35 -8.25,-6.35 ; -7.75,8.89 -8.25,8.89 ; -0.5,0 0,0 ; 0,-0.5 0,0 ; 0,0.5 0,0 ; 0.5,0 0,0 ; 7.75,-8.89 8.25,-8.89 ; 7.75,-6.35 8.25,-6.35 ; 7.75,8.89 8.25,8.89 ; 8.25,-9.39 8.25,-8.89 ; 8.25,-8.39 8.25,-8.89 ; 8.25,-6.85 8.25,-6.35 ; 8.25,-5.85 8.25,-6.35 ; 8.25,8.39 8.25,8.89 ; 8.25,9.39 8.25,8.89 ; 8.75,-8.89 8.25,-8.89 ; 8.75,-6.35 8.25,-6.35 ; 8.75,8.89 8.25,8.89 ; -9.65,-9.59 -6.85,-9.59 -6.85,-8.19 -9.65,-8.19 -9.65,-9.59 ; -9.65,-7.05 -6.85,-7.05 -6.85,-5.65 -9.65,-5.65 -9.65,-7.05 ; -9.65,8.19 -6.85,8.19 -6.85,9.59 -9.65,9.59 -9.65,8.19 ; 6.85,-9.59 9.65,-9.59 9.65,-8.19 6.85,-8.19 6.85,-9.59 ; 6.85,-7.05 9.65,-7.05 9.65,-5.65 6.85,-5.65 6.85,-7.05 ; 6.85,8.19 9.65,8.19 9.65,9.59 6.85,9.59 6.85,8.19
Mechanical 14:
  circle w0.1: c-5.35,8.94 r0.5
  lines w0.1: -6.85,-9.39 -9.05,-9.39 -9.05,-8.39 -6.85,-8.39 ; -6.85,-6.85 -9.05,-6.85 -9.05,-5.85 -6.85,-5.85 ; -6.85,8.39 -9.05,8.39 -9.05,9.39 -6.85,9.39 ; 6.85,-9.39 9.05,-9.39 9.05,-8.39 6.85,-8.39 ; 6.85,-6.85 9.05,-6.85 9.05,-5.85 6.85,-5.85 ; 6.85,8.39 9.05,8.39 9.05,9.39 6.85,9.39 ; -6.85,-12 6.85,-12 6.85,12 -6.85,12 -6.85,-12
Mechanical 15:
  lines w0.05: -9.9,-12.25 9.9,-12.25 9.9,12.25 -9.9,12.25 -9.9,-12.25
3D body "DCDC-TRACO_TES2N.stp": height 8.45, standoff 0, extent -9.05,-12 9.05,12

## DCDC_PICO_SMV [mil] "SMV Series, SMD DC/DC Converter,  Body 12.7x12.7mm"
height 439.76
pads (5):
  rect 130x60 smd: 1(-272.5,-175) 2(-272.5,175) 3(272.5,175) 4(272.5,0) 5(272.5,-175)
Top Overlay:
  circle w19.68: c-303.15,-237.21 r9.84
  lines w7.87: -250,-220.75 -250,-250 250,-250 250,-220.75 ; -250,-129.25 -250,129.25 ; -250,220.75 -250,250 250,250 250,220.75 ; 250,-129.25 250,-45.75 ; 250,45.75 250,129.25
  text "COM" at 65.5,-19.29 h39.37
  text "OUT+" at 31.05,-192.32 h39.37
  text "OUT-" at 31.05,157.68 h39.37
  text "IN-" at -185.48,154.72 h39.37
  text "IN+" at -185.48,-195.28 h39.37
Mechanical 8:
  lines w3.94: -292.19,-175 -272.5,-175 ; -292.19,175 -272.5,175 ; -272.5,-194.69 -272.5,-175 ; -272.5,-155.31 -272.5,-175 ; -272.5,155.31 -272.5,175 ; -272.5,194.69 -272.5,175 ; -252.82,-175 -272.5,-175 ; -252.82,175 -272.5,175 ; -19.69,0 0,0 ; 0,-19.69 0,0 ; 0,19.69 0,0 ; 19.68,0 0,0 ; 252.82,-175 272.5,-175 ; 252.82,0 272.5,0 ; 252.82,175 272.5,175 ; 272.5,-194.69 272.5,-175 ; 272.5,-155.31 272.5,-175 ; 272.5,-19.69 272.5,0 ; 272.5,19.69 272.5,0 ; 272.5,155.31 272.5,175 ; 272.5,194.69 272.5,175 ; 292.19,-175 272.5,-175 ; 292.19,0 272.5,0 ; 292.19,175 272.5,175 ; -337.5,-205 -337.5,-145 -207.5,-145 -207.5,-205 -337.5,-205 ; -337.5,145 -337.5,205 -207.5,205 -207.5,145 -337.5,145 ; 207.5,-205 207.5,-145 337.5,-145 337.5,-205 207.5,-205 ; 207.5,-30 207.5,30 337.5,30 337.5,-30 207.5,-30 ; 207.5,145 207.5,205 337.5,205 337.5,145 207.5,145
Mechanical 14:
  circle w3.94: c-303.15,-237.21 r19.68
  lines w3.94: -250,-188.39 -310,-188.39 -310,-161.61 -250,-161.61 ; -250,161.61 -310,161.61 -310,188.39 -250,188.39 ; 250,-188.39 310,-188.39 310,-161.61 250,-161.61 ; 250,-13.39 310,-13.39 310,13.39 250,13.39 ; 250,161.61 310,161.61 310,188.39 250,188.39 ; -250,-250 -250,250 250,250 250,-250 -250,-250
  text "COM" at 65.5,-19.29 h39.37
  text "OUT+" at 31.05,-192.32 h39.37
  text "OUT-" at 31.05,157.68 h39.37
  text "IN-" at -185.48,154.72 h39.37
  text "IN+" at -185.48,-195.28 h39.37
Mechanical 15:
  lines w1.97: -347.34,-259.84 347.34,-259.84 347.34,259.84 -347.34,259.84 -347.34,-259.84
3D body "DCDC_PICO_SMV.stp": height 440, standoff 0, extent -310,-250 310,250

## DCDC_TRACO_TES1-XX1X [mm] "TES 1 Series, Single Output DC/DC Converter,  Body 13.7x8mm"
height 7.25
pads (5):
  rect 1.6x1 smd: 1(-5,3.81) 3(-5,1.27) 7(-5,-3.81) 8(5,-3.81) 14(5,3.81)
Top Overlay:
  circle w0.5: c-3.125,5.975 r0.25
  circle w0.25: c-5,5 r0.125
  lines w0.2: -4.125,-4.81 -4.125,-6.975 4.125,-6.975 4.125,-4.81 ; -4.125,-2.81 -4.125,0.27 ; -4.125,2.27 -4.125,2.81 ; -4.125,4.81 -4.125,6.975 4.125,6.975 4.125,4.81 ; 4.125,-2.81 4.125,2.81
  text "Vin" at -1.436,2.04 h1
  text "Vout" at -1.436,-4.31 h1
  text "-" at -3.5,3.31 h1
  text "+" at -3.5,0.77 h1
  text "-" at -3.5,-4.31 h1
  text "+" at 2.59,-4.31 h1
Mechanical 8:
  lines w0.05: -5.5,-3.81 -5,-3.81 ; -5.5,1.27 -5,1.27 ; -5.5,3.81 -5,3.81 ; -5,-4.31 -5,-3.81 ; -5,-3.31 -5,-3.81 ; -5,0.77 -5,1.27 ; -5,1.77 -5,1.27 ; -5,3.31 -5,3.81 ; -5,4.31 -5,3.81 ; -4.5,-3.81 -5,-3.81 ; -4.5,1.27 -5,1.27 ; -4.5,3.81 -5,3.81 ; -0.5,0 0,0 ; 0,-0.5 0,0 ; 0,0.5 0,0 ; 0.5,0 0,0 ; 4.5,-3.81 5,-3.81 ; 4.5,3.81 5,3.81 ; 5,-4.31 5,-3.81 ; 5,-3.31 5,-3.81 ; 5,3.31 5,3.81 ; 5,4.31 5,3.81 ; 5.5,-3.81 5,-3.81 ; 5.5,3.81 5,3.81
Mechanical 14:
  circle w0.1: c-3.125,5.975 r0.5
  lines w0.1: -4.125,-6.975 -4.125,6.975 4.125,6.975 4.125,-6.975 -4.125,-6.975
  text "+" at 2.59,-4.31 h1
  text "-" at -3.5,-4.31 h1
  text "+" at -3.5,0.77 h1
  text "-" at -3.5,3.31 h1
  text "Vout" at -1.436,-4.31 h1
  text "Vin" at -1.436,2.04 h1
Mechanical 15:
  lines w0.05: -6.05,-7.225 6.05,-7.225 6.05,7.225 -6.05,7.225 -6.05,-7.225
3D body "DCDC_TRACO_TES1-xx1x.stp": height 7.25, standoff 0, extent -5.6,-6.975 5.6,6.975